# Altium integrated library Utiliti_Library.IntLib: 517 symbols (part 1 of 4) (continued)
## USB_TypeB (continued)
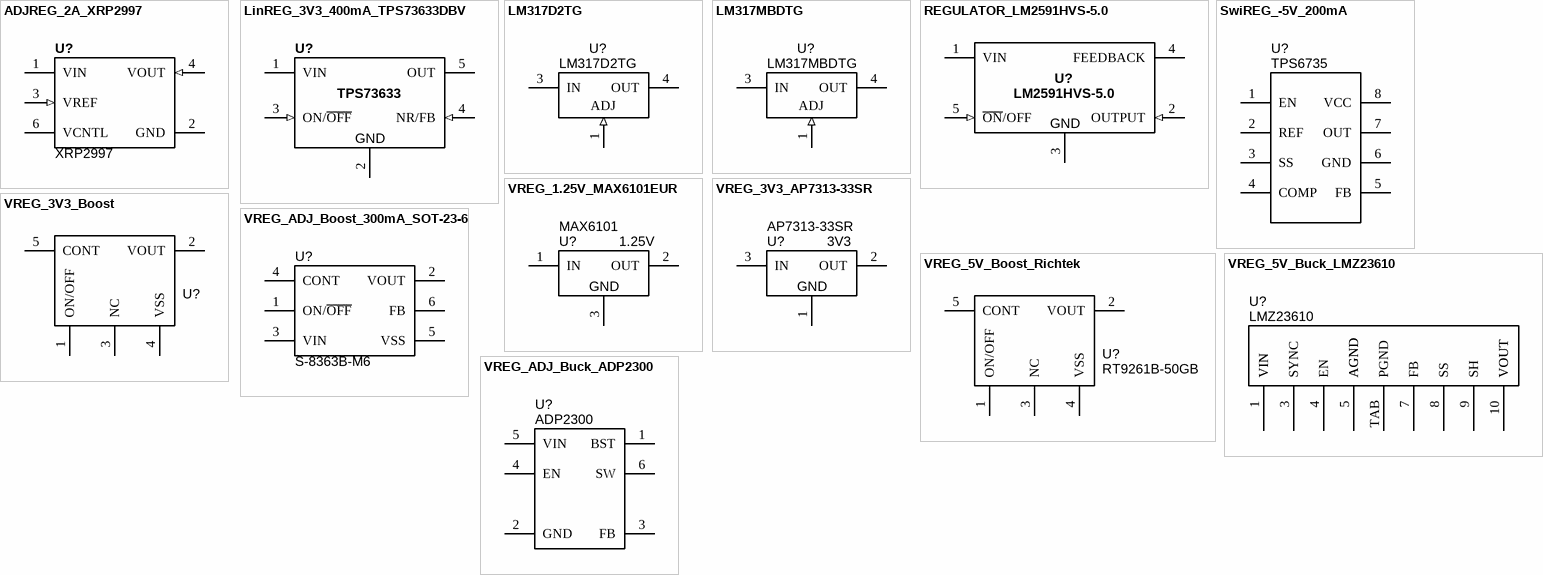
[diagram p2: symbols ADJREG_2A_XRP2997 to VREG_ADJ_Buck_ADP2300]

## ADJREG_2A_XRP2997
designator U?, comment XRP2997
IC Adjustable Regulator 2A 8-SOIC-EP SMD; Manufacturer 1: Exar Corporation; Manufacturer Part Number 1: XRP2997IDBTR-F; Voltage Regulator Type: Switching Buck; Tolerance: ±20mV; Ratings: 5.5Vin Max; Value: 3.3V; 400mA; Voltage - Input: 1.1V to 5.5V; Voltage - Dropout (Typical): 0.075V @ 400mA; Current - Output: 2A (Max); SCDType: spec; Package / Case: 8-SOIC (0.154", 3.90mm Width) Exposed Pad; Voltage - Output: Adjustable; Supplier 1: Digi-Key; Supplier Part Number 1: 1016-1702-1-ND; Operating Temperature: -40°C ~ 85°C
footprint SOIC127P600X175-9N (SOIC, 8-Leads with thermal tab, Body 4.9x3.9mm, Pitch 1.27mm, IPC Medium Density)
pins: 1 VIN (power), 2 GND (power), 3 VREF (in), 4 VOUT (in), 6 VCNTL (power), 9 GND (power) hidden to GND

## LinREG_3V3_400mA_TPS73633DBV
designator U?, comment 3.3V  (value not drawn)
IC LDO Regulator 3.3V 400mA SOT23-5 SMD; Manufacturer 1: Texas Instruments; Manufacturer Part Number 1: TPS73633DBVT; Voltage Regulator Type: Switching Buck; Tolerance: ±0.5%; Ratings: 5.5Vin Max; Value: 3.3V; 400mA; Regulator Topology: Positive Fixed; Voltage - Input: 3.5V to 5.5V; Voltage - Dropout (Typical): 0.075V @ 400mA; Current - Output: 400mA (Max); SCDType: spec; Package / Case: SOT23-5; Supplier 1: Digi-Key; Supplier Part Number 1: 296-15819-1-ND; Voltage - Output: 3.3V; Current - Limit (Min): 400mA; ComponentLink1URL: http://www.ti.com/lit/ds/symlink/tps73601.pdf; ComponentLink1Description: http://www.ti.com/lit/ds/symlink/tps73601.pdf
footprint SOT23-5
pins: 1 VIN (power), 2 GND (power), 3 ON/~{OFF} (in), 4 NR/FB (in), 5 OUT (power)
text: TPS73633

## LM317D2TG
designator U?, comment Manufacturer Part Number 1: LM317D2TG  (hidden comment: Adjustable)
Voltage Regulator IC, D2PAK SMD, LM317D2TG; Manufacturer 1: ON Semiconductor; Voltage Regulator Type: Adjustable Positive Linear; Tolerance: 0.04%; Ratings: 40V; 1.5A; Value: variable; SCDType: spec*; Package / Case: D2PAK; Supplier 1: Digi-Key; Supplier Part Number 1: LM317D2TGOS-ND
footprint D2PAK-3 (D-PAK/TO-263-3; 3 Leads (1 Cropped); Body 14.7 (inc. leads) x 10.2 mm (LxW max))
pins: 1 ADJ (in), 3 IN (power), 4 OUT (power)

## LM317MBDTG
designator U?, comment Manufacturer Part Number 1: LM317MBDTG  (hidden comment: Adjustable)
Voltage Regulator IC, DPAK SMD, LM317MBDTG; Manufacturer 1: ON Semiconductor; Voltage Regulator Type: Adjustable Positive Linear; Tolerance: 0.04%; Ratings: 40V in-out; 500mA; Value: variable; SCDType: spec\; Package / Case: DPAK/TO-252; Supplier 1: Digi-Key; Supplier Part Number 1: LM317MBDTGOS-ND
footprint TO-252 (D-PAK/TO-252-AA; 3 Leads (1 Cropped); Body 10.3 (inc. leads) x 6.7 mm (LxW max))
pins: 1 ADJ (in), 3 IN (power), 4 OUT (power)

## REGULATOR_LM2591HVS-5.0
designator U?, comment Manufacturer Part Number 1: LM2591HVS-5.0  (hidden comment: Adjustable)
Switching Voltage Regulator IC, TO-263-5 SMD, LM2591HVS-5.0; Manufacturer 1: National Semiconductor; Voltage Regulator Type: Switching Buck; Tolerance: ±4%; Ratings: 60Vin Max; 150kHz; Value: 5V; 1A; SCDType: source; Package / Case: TO-263-5; Supplier 1: Digi-Key; Supplier Part Number 1: LM2591HVS-5.0-ND
footprint TO-263-5 (D-PAK/TO-263-5; 5 Leads; Body 14.4 (inc. leads) x 10.4 mm (LxW max))
pins: 1 VIN (power), 2 OUTPUT (in), 3 GND (power), 4 FEEDBACK (power), 5 ~{ON}/OFF (in)

## SwiREG_-5V_200mA
designator U?, comment TPS6735
IC REG 200mA -5V SOIC-8 SMD; Manufacturer 1: Texas Instruments; Manufacturer Part Number 1: TPS6735ID; Ratings: -5V @ 200mA; Output Type: Fixed; Voltage - Input: 4 V ~ 6.2 V; PWM Type: Current Mode; Frequency - Switching: 160kHz; Synchronous Rectifier: No; SCDType: spec; Supplier 1: Digi-Key; Supplier Part Number 1: 296-10982-5-ND; Type: Inverting; Voltage - Output: -5V; Operating Temperature: -40°C ~ 85°C; Supplier Device Package: 8-SOIC; ComponentLink1URL: http://www.ti.com/lit/ds/slvs141a/slvs141a.pdf; ComponentLink1Description: http://www.ti.com/lit/ds/slvs141a/slvs141a.pdf; Package / Case: 8-SOIC (0.154", 3.90mm Width)
footprint SOIC127P600X175-8AN (SOIC, 8-Leads, Body 4.9x3.9mm, Pitch 1.27mm, IPC Medium Density)
pins: 1 EN, 2 REF, 3 SS, 4 COMP, 5 FB, 6 GND, 7 OUT, 8 VCC

## VREG_1.25V_MAX6101EUR
designator U?, comment MAX6101  value 1.25V
Voltage Regulator 1.25V SOT23-3 SMD; Manufacturer 1: Maxim Integrated Products; Manufacturer Part Number 1: MAX6101EUR+T; Voltage Regulator Type: Adjustable Positive Linear; Tolerance: ±0.04%; Ratings: 40V in-out; 500mA; SCDType: spec; Package / Case: SOT23-3; Supplier 1: Digi-Key; Supplier Part Number 1: MAX6101EUR+TCT-ND
footprint SOT23-3 (SOT23, 3 pin)
pins: 1 IN (power), 2 OUT (power), 3 GND (power)

## VREG_3V3_AP7313-33SR
designator U?, comment AP7313-33SR  value 3V3
Voltage Regulator 3.3V LDO SOT23R-3 SMD; Manufacturer 1: Diodes Inc; Manufacturer Part Number 1: AP7313-33SRG-7; Voltage Regulator Type: Low Drop-Out (LDO); Tolerance: ±2%; Ratings: 6Vin; 150mA; SCDType: source; Package / Case: SOT23R-3; Supplier 1: Digi-Key; Supplier Part Number 1: AP7313-33SRG-7DICT-ND; ComponentLink1URL: http://www.diodes.com/datasheets/AP7313.pdf; ComponentLink1Description: AP7313 datasheet
footprint SOT23-3 (SOT23, 3 pin)
pins: 1 GND (power), 2 OUT (power), 3 IN (power)

## VREG_3V3_Boost
designator U?  (value not drawn)
Regulator 3.3V Step-Up Converter; Manufacturer 1: Richtek USA Inc; Manufacturer Part Number 1: RT9261B-33GB; Ratings: 3.3V; 50mA; Output Type: Fixed; Voltage - Input: Up to 7V; PWM Type: VFM; Frequency - Switching: 190kHz; Current - Output: 50mA; Synchronous Rectifier: No; SCDType: undef; Package / Case: SOT-23-5; Type: Step-Up (Boost); Voltage - Output: 3.3V; Operating Temperature: -20°C ~ 85°C; ComponentLink1URL: http://www.richtek.com/download_ds.jsp?s=267; ComponentLink1Description: RT9261B-33GB Datasheet; Supplier Part Number 1: RT9261B-33GB-ND; Supplier 1: Digi-Key
footprint SOT23-5
pins: 1 ON/OFF, 2 VOUT, 3 NC, 4 VSS, 5 CONT

## VREG_5V_Boost_Richtek
designator U?  Manufacturer Part Number 1: RT9261B-50GB  (hidden comment: *)
Regulator VFM 5.0V Step-Up DC-DC Converter; Manufacturer 1: Richtek USA Inc; Ratings: 5V; 160mA; SCDType: source; Package / Case: SOT-23-5; Material: Si; Supplier 1: Digi-Key; Supplier Part Number 1: RT9261B-50GB-ND; ComponentLink1URL: http://www.richtek.com/download_ds.jsp?s=267; ComponentLink1Description: http://www.richtek.com/download_ds.jsp?s=267
footprint SOT23-5
pins: 1 ON/OFF, 2 VOUT, 3 NC, 4 VSS, 5 CONT

## VREG_5V_Buck_LMZ23610
designator U?, comment LMZ23610
Voltage Regulator 10A 5V TO-PMOD-11; Manufacturer 1: National Semiconductor (TI); Manufacturer Part Number 1: LMZ23610TZ/NOPB; Ratings: 6Vin; 50W; Tolerance: ±0.2%; Value: Variable; SCDType: undef; Supplier 1: Digi-Key; Supplier Part Number 1: LMZ23610TZ/NOPB-ND; ComponentLink1URL: http://www.ti.com/lit/ds/symlink/lmz23610.pdf; ComponentLink1Description: http://www.ti.com/lit/ds/symlink/lmz23610.pdf
footprint NATIONALSEMI-TZA11A (National Semi TZA11A package)
pins: 1 VIN, 2 VIN, 3 SYNC, 4 EN, 5 AGND, 6 AGND, 7 FB, 8 SS, 9 SH, 10 VOUT, 11 VOUT, TAB PGND

## VREG_ADJ_Boost_300mA_SOT-23-6
designator U?  Manufacturer Part Number 1: S-8363B-M6  (hidden comment: *)
Regulator adjustable switching step-up DC-DC converter; Manufacturer 1: Seiko Instruments Inc.; Ratings: 5V; 300mA; 1.2MHz; SCDType: source; Package / Case: SOT-23-6; Supplier 1: Mouser; Supplier Part Number 1: 628-S-8363B-M6T1U2; ComponentLink1URL: http://datasheet.sii-ic.com/en/switching_regulator/S8363_E.pdf; ComponentLink1Description: http://datasheet.sii-ic.com/en/switching_regulator/S8363_E.pdf
footprint SOT23-6
pins: 1 ON/~{OFF}, 2 VOUT, 3 VIN (power), 4 CONT, 5 VSS (power), 6 FB (power)

## VREG_ADJ_Buck_ADP2300
designator U?, comment ADP2300
Regulator adjustable switching step-down DC/DC converter; Manufacturer 1: Analog Devices Inc; Manufacturer Part Number 1: ADP2300AUJZ-R7; Ratings: Adj; 1.2A; SCDType: undef; Package / Case: SOT-23-6; Supplier 1: Digi-Key; Supplier Part Number 1: ADP2300AUJZ-R7CT-ND; ComponentLink1URL: http://www.analog.com/static/imported-files/data_sheets/ADP2300_2301.pdf; ComponentLink1Description: http://www.analog.com/static/imported-files/data_sheets/ADP2300_2301.pdf
footprint SOT23-6
pins: 1 BST, 2 GND, 3 FB, 4 EN, 5 VIN, 6 SW


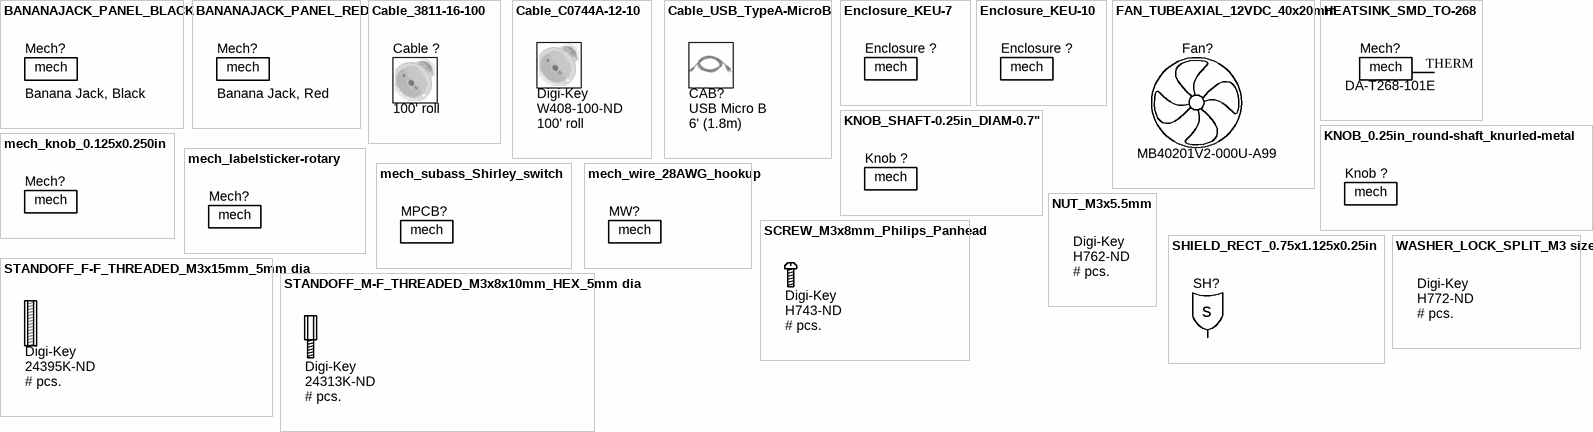
[diagram p3: symbols BANANAJACK_PANEL_BLACK to WASHER_LOCK_SPLIT_M3 size]

## BANANAJACK_PANEL_BLACK
designator Mech?, comment Banana Jack, Black  (mechanical)
Banana jack panel mount black; Manufacturer 1: Emerson Network Power Connectivity Solutions; Manufacturer Part Number 1: 108-0903-001; SCDType: undef; Supplier 1: Digi-Key; Supplier Part Number 1: J152-ND
text: mech

## BANANAJACK_PANEL_RED
designator Mech?, comment Banana Jack, Red  (mechanical)
Banana jack panel mount red; Manufacturer 1: Emerson Network Power Connectivity Solutions; Manufacturer Part Number 1: 108-0902-001; SCDType: undef; Supplier 1: Digi-Key; Supplier Part Number 1: J151-ND
text: mech

## Cable_3811-16-100
designator Cable ?, comment 100' roll  (mechanical)
Ribbon cable 26 AWG 16-conductor 1.27mm pitch; Manufacturer 1: 3M; QtyOverride: .01; Value: 1' section; Number of Conductors: 16; Voltge Rating: 300 V; Stranding: 7 x 34 AWG; SCDType: undef; Supplier 1: Mouser; Supplier Part Number 1: 517-3811/16; Manufacturer Part Number 1: 3811/16-100; Parameter Name: Ribbon Cable; Color: Multicolor

## Cable_C0744A-12-10
designator *, comment 100' roll  Supplier 1: Digi-Key  Supplier Part Number 1: W408-100-ND
Cable, SHIELDED 24AWG UL2464 8 COND; Manufacturer 1: General Cable/Carol Brand; Manufacturer Part Number 1: C0744A-12-10; Cable Type: Multi-Conductor; Conductor Insulation: Poly-Vinyl Chloride (PVC); Conductor Material: Copper, Tinned; Conductor Strand: 7 Strands / 32 AWG; Jacket (Insulation) Diameter: 0.215" (5.46mm); Jacket (Insulation) Thickness: 0.032" (0.81mm); Number of Conductors: 8; Shield Coverage: 100%; Shield Material: Flexfoil®; Shield Type: Foil; Usage: Computer; Voltage: 300V; QtyOverride: .12; Value: 5' section; SCDType: undef; Category: Cables Wires; Color: Gray; Features: Drain Wire; Jacket (Insulation) Material: Poly-Vinyl Chloride (PVC); Length: 100' (30.5m); Operating Temperature: -20°C ~ 80°C; Wire Gauge: 24 AWG; ComponentLink1URL: http://www.generalcable.com/NR/rdonlyres/E79F504B-B22F-45DB-9843-849435C5B1BE/0/Pg39_40MltiCondfoilShield.pdf; ComponentLink1Description: http://www.generalcable.com/NR/rdonlyres/E79F504B-B22F-45DB-9843-849435C5B1BE/0/Pg39_40MltiCondfoilShield.pdf; Package / Case: 100' roll
footprint ClarisonicLogo (Clarisonic Logo 0.360" height)

## Cable_USB_TypeA-MicroB
designator CAB?, comment USB Micro B  Length: 6' (1.8m)  (mechanical)
Cable 6ft USB 2.0 A Male to Micro 5pin Male; Manufacturer 1: Monoprice.com; Manufacturer Part Number 1: 4868; Number of Conductors: 5; Value: 6' section; Cable Type: USB Type A to Micro-B; Wire Gauge: 28/28 AWG; SCDType: undef; Color: Black

## Enclosure_KEU-7
designator Enclosure ?  (value not drawn)  (mechanical)
Enclosure with keyboard panel 5.1x7.1x3.0in; Manufacturer 1: PacTec; Manufacturer Part Number 1: 63100-510-000; SCDType: undef; Supplier 1: Mouser; Supplier Part Number 1: 616-63100-510-000
text: mech

## Enclosure_KEU-10
designator Enclosure ?  (value not drawn)  (mechanical)
Enclosure with keyboard panel 8.1x10.1x4.0in; Manufacturer 1: PacTec; Manufacturer Part Number 1: 62291-510-000 KEU-10 Black Kit; SCDType: undef; Supplier 1: Mouser; Supplier Part Number 1: 616-62291-510-000; ComponentLink1URL: http://www.pactecenclosures.com/Plastic-Enclosures/drw_KEU-10.pdf; ComponentLink1Description: http://www.pactecenclosures.com/Plastic-Enclosures/drw_KEU-10.pdf
text: mech

## FAN_TUBEAXIAL_12VDC_40x20mm
designator Fan?, comment Manufacturer Part Number 1: MB40201V2-000U-A99  (hidden comment: tubeaxial fan)  (mechanical)
Fan tubeaxial 40x20mm 7.7 CFM 21 dBA 12 VDC; Manufacturer 1: Sunon Fans; Noise: 21 dB(A); RPM: 6200 RPM; Power Rating: 0.60W; Voltage - Rated: 12VDC; SCDType: undef; Supplier 1: Digi-Key; Supplier Part Number 1: 259-1554-ND; ComponentLink1URL: http://www.sunon.com.tw/products/pdf/DCFAN/MB4020.pdf; ComponentLink1Description: http://www.sunon.com.tw/products/pdf/DCFAN/MB4020.pdf; Size / Dimension: Square - 40mm L x 40mm H x 20mm W; Weight: 0.068 lb (30.84g)

## HEATSINK_SMD_TO-268
designator Mech?, comment Manufacturer Part Number 1: DA-T268-101E  (hidden comment: SMD heat sink)
Heat sink for TO-268 SMD; Manufacturer 1: Ohmite; For Use With/Related Products: Rotary Switches and Encoders; Power Dissipation @ Temperature Rise: 5W @ 35°C; SCDType: undef; Supplier 1: Digi-Key; Supplier Part Number 1: DA-T268-101E-ND; Height Off Base (Height of Fin): 0.400" (10.16mm); Length: 0.500" (12.70mm); Supplier 2: Digi-Key; Supplier Part Number 2: DV-T268-101E-ND; Manufacturer 2: Ohmite; Manufacturer Part Number 2: DV-T268-101E; ComponentLink2URL: http://media.digikey.com/pdf/Data%20Sheets/Ohmite%20PDFs/D_Series.pdf; ComponentLink2Description: http://media.digikey.com/pdf/Data%20Sheets/Ohmite%20PDFs/D_Series.pdf; ComponentLink1URL: http://media.digikey.com/pdf/Data%20Sheets/Ohmite%20PDFs/D_Series.pdf; ComponentLink1Description: http://media.digikey.com/pdf/Data%20Sheets/Ohmite%20PDFs/D_Series.pdf
footprint HEATSINK_TO-268 (SMD heatsink for use with TO-268 / D3-PAK component)
pins: THERM GND
text: mech

## KNOB_0.25in_round-shaft_knurled-metal
designator Knob ?, comment round knurled knob  (value not drawn)  (mechanical)
Knob metal 0.25in diameter clear matte; Manufacturer 1: Kilo International; Manufacturer Part Number 1: OESA-50-3-5; Accessory Type: Knob - Metal; For Use With/Related Products: 1/4" round shaft potentiometers; Knob / Dial Style: Round 12.7mm with 17.4mm skirt; Shaft Diameter: 6.35mm; SCDType: undef; Shaft Type: Round; Knob Material: metal; Color: Clear matte; Supplier 1: Digi-Key; Supplier Part Number 1: 226-3148-ND; ComponentLink1URL: http://media.digikey.com/pdf/Data%20Sheets/Kilo%20International%20PDFs/OES.pdf; ComponentLink1Description: http://media.digikey.com/pdf/Data%20Sheets/Kilo%20International%20PDFs/OES.pdf
text: mech

## KNOB_SHAFT-0.25in_DIAM-0.7"
designator Knob ?, comment round fluted knob  (value not drawn)  (mechanical)
Knob plastic 0.125in diameter black; Manufacturer 1: GRAYHILL; Manufacturer Part Number 1: 11K5014-KCNB; Accessory Type: Knob - Black; For Use With/Related Products: Rotary Switches and Encoders; Shaft Diameter: 6.35; Knob Material: Nylon; Knob Dia - Imperial: 0.7"; Knob Dia - Metric: 17.78; SCDType: undef; ComponentLink1URL: http://www.grayhill.com/web1/pdf/control%20knob%20accessories%20encoder.pdf; ComponentLink1Description: http://www.grayhill.com/web1/pdf/control%20knob%20accessories%20encoder.pdf; Supplier 1: Newark; Supplier Part Number 1: 05C2120; Knob / Dial Style: Round Fluted; Shaft Type: Round; Color: Black
text: mech

## mech_knob_0.125x0.250in
designator Mech?  (value not drawn)  (mechanical)
Knob plastic 0.125in diameter black; Manufacturer 1: Grayhill Inc; Manufacturer Part Number 1: 11K5017-JCNB; Accessory Type: Knob - Black; For Use With/Related Products: Rotary Switches and Encoders; SCDType: undef; Supplier 1: Digi-Key; Supplier Part Number 1: GH7335-ND; ComponentLink1URL: http://www.grayhill.com/web1/pdf/control%20knob%20accessories%20encoder.pdf; ComponentLink1Description: http://www.grayhill.com/web1/pdf/control%20knob%20accessories%20encoder.pdf
text: mech

## mech_labelsticker-rotary
designator Mech?  (value not drawn)  (mechanical)
Label sticker for rotary switch; Manufacturer 1: Grayhill Inc; Manufacturer Part Number 1: 71SS1073-1; Accessory Type: Stop Pin Sticker; For Use With/Related Products: 71AD Series; SCDType: undef; Supplier 1: Digi-Key; Supplier Part Number 1: 71SS1073-1-ND; ComponentLink1URL: http://lgrws01.grayhill.com/web1/images/ProductImages/Rotary_71.pdf; ComponentLink1Description: http://lgrws01.grayhill.com/web1/images/ProductImages/Rotary_71.pdf
text: mech

## mech_subass_Shirley_switch
designator MPCB?  (value not drawn)  (mechanical)
Assy, PCB switch subassembly; SCDType: undef
text: mech

## mech_wire_28AWG_hookup
designator MW?  (value not drawn)  (mechanical)
Wire, 28AWG, insulated; Manufacturer 1: Any; Value: 45mm piece; SCDType: undef; Package / Case: 28AWG insulated
text: mech

## NUT_M3x5.5mm
designator *, comment # pcs.  Supplier 1: Digi-Key  Supplier Part Number 1: H762-ND  (mechanical)
NUT HEX METRIC M 3 ZINC; Manufacturer 1: B&F Fastener Supply; Manufacturer Part Number 1: MHNZ 003; Thread Size: M3; SCDType: undef; RoHS: RoHS non-compliant; Description 1: NUT HEX METRIC M 3 ZINC; Category: Hardware Fasteners Accessories; Stock 1: 9500; Pricing 1: 100=0.0384, 1000=0.03072 (USD); Type: Hex; Thickness: -; Width: 0.217" (5.5mm); Quantity: -; Material: -; Plating: Zinc

## SCREW_M3x8mm_Philips_Panhead
designator *, comment # pcs.  Supplier 1: Digi-Key  Supplier Part Number 1: H743-ND  (mechanical)
SCREW MACHINE METRIC PH M3X8MM; Manufacturer 1: B&F Fastener Supply; Manufacturer Part Number 1: MPMS 003 0008 PH; Screw Head Type: Phillips Panhead; Thread Size: M3; Head Height: 0.090" (2.29mm); Plating: Zinc; SCDType: undef; RoHS: RoHS non-compliant; Description 1: SCREW MACHINE METRIC PH M3X8MM; Category: Hardware Fasteners Accessories; Stock 1: 8200; Pricing 1: 100=0.066, 1000=0.0528 (USD); Type: Machine Screw; Length - Below Head: 0.315" (8.00mm); Material: -; ComponentLink1URL: http://www.fasnetdirect.com/refguide/Machinepancombo.pdf; ComponentLink1Description: http://www.fasnetdirect.com/refguide/Machinepancombo.pdf

## SHIELD_RECT_0.75x1.125x0.25in
designator SH?  (value not drawn)
Fotofab standard RF shield 0.75x1.125x0.25in; SCDType: undef; Supplier 1: Digi-Key; Supplier Part Number 1: 655-1002-ND; Manufacturer 1: Fotofab; Manufacturer Part Number 1: 0.75 X 1.125 X 0.25
footprint SHIELD_RECT_0.75x1.125x0.25in (Fotofab standard RF shield, 1.125"x0.75", 0.25" tall)
pins: SH
text: s

## STANDOFF_F-F_THREADED_M3x15mm_5mm dia
designator *, comment # pcs.  Supplier 1: Digi-Key  Supplier Part Number 1: 24395K-ND  (mechanical)
STANDOFF METRIC HEX M3 THD 15MM; Manufacturer 1: Keystone Electronics; Manufacturer Part Number 1: 24395; Thread/Screw/Hole Size: M3 Thread; Plating: Nickel; Between Board Height: 0.591" (15.0mm); SCDType: undef; RoHS: RoHS Compliant; Description 1: STANDOFF METRIC HEX M3 THD 15MM; Category: Hardware Fasteners Accessories; Stock 1: 2380; Pricing 1: 10=0.79, 100=0.7595, 500=0.4995, 1000=0.3189, 2500=0.2962 (USD); Type: Hex Threaded, Female/Female; Size: 0.197" (5.0mm) Hex; Length - Overall: 0.590" (15.0mm); Material: Brass; Color: Natural; ComponentLink1URL: http://www.keyelco.com/pdfs/M55-prod30.pdf; ComponentLink1Description: http://www.keyelco.com/pdfs/M55-prod30.pdf

## STANDOFF_M-F_THREADED_M3x8x10mm_HEX_5mm dia
designator *, comment # pcs.  Supplier 1: Digi-Key  Supplier Part Number 1: 24313K-ND  (mechanical)
STANDOFF M/F MET 5MM HEX 10MM L; Manufacturer 1: Keystone Electronics; Manufacturer Part Number 1: 24313; Thread/Screw/Hole Size: M3 Thread; Plating: Nickel; Between Board Height: 0.394" (10.0mm); SCDType: undef; RoHS: RoHS Compliant; Description 1: STANDOFF M/F MET 5MM HEX 10MM L; Category: Hardware Fasteners Accessories; Stock 1: 240; Pricing 1: 10=0.969, 100=0.881, 500=0.58, 1000=0.3685, 2500=0.34215 (USD); Type: Hex Threaded, Male/Female; Size: 0.197" (5.0mm) Hex; Length - Overall: 0.709" (18.0mm); Material: Brass; Color: Natural; ComponentLink1URL: http://www.keyelco.com/pdfs/M55p67.pdf; ComponentLink1Description: http://www.keyelco.com/pdfs/M55p67.pdf

## WASHER_LOCK_SPLIT_M3 size
designator *, comment # pcs.  Supplier 1: Digi-Key  Supplier Part Number 1: H772-ND  (mechanical)
WASHER SPLIT LOCK METRIC M 3 ZINC; Manufacturer 1: B&F Fastener Supply; Manufacturer Part Number 1: MLWZ 003; Description 1: WASHER LOCK METRIC M 3 ZINC; Thread/Screw/Hole Size: Metric 3; SCDType: undef; Category: Hardware Fasteners Accessories; Type: Split Lock; Diameter - Inside: 0.122" (3.1mm); Diameter - Outside: 0.217" (5.5mm); Thickness: 0.039" (1.0mm); Plating: Zinc; Material: Steel


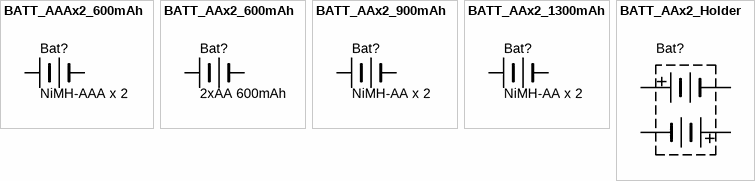
[diagram p4: symbols BATT_AAAx2_600mAh to BATT_AAx2_Holder]

## BATT_AAAx2_600mAh
designator Bat?, comment NiMH-AAA x 2  (no BOM)
Battery pack, 2-cell AAA; Manufacturer 1: JJJ; Manufacturer Part Number 1: NiMH-AAA-2-600-PB7; Ratings: 600 mAh; Package / Case: per dwg
footprint BAT-AAA-2 (AAA battery pack, 2 side by side)
pins: 1, 2

## BATT_AAx2_600mAh
designator Bat?, comment 2xAA 600mAh  (no BOM)
Battery pack NiMH 600mAh 2-cell AA; Manufacturer 1: Gold Peak; Manufacturer Part Number 1: 60AAM2B2H PB3; Package / Case: per dwg; Ratings: 600 mAh
footprint BAT-AA-2 (AA battery, 2 side by side)
pins: 1, 2

## BATT_AAx2_900mAh
designator Bat?, comment NiMH-AA x 2  (no BOM)
Battery pack, 2-cell AA; Manufacturer 1: JJJ; Manufacturer Part Number 1: NiMH-AA-2-900-PB3; Ratings: 900 mAh; Package / Case: per dwg
footprint BAT-AA-2 (AA battery, 2 side by side)
pins: 1, 2

## BATT_AAx2_1300mAh
designator Bat?, comment NiMH-AA x 2  (no BOM)
Battery pack, 2-cell AA; Manufacturer 1: JJJ; Manufacturer Part Number 1: NiMH-AA-2-1300-PB1; Ratings: 1300 mAh; Package / Case: per dwg
footprint BAT-AA-2 (AA battery, 2 side by side)
pins: 1, 2

## BATT_AAx2_Holder
designator Bat?, comment NiMH-AA x 2  (value not drawn)
Battery holder 2xAA PCB mount; Manufacturer 1: MPD (Memory Protection Devices); Manufacturer Part Number 1: BK-6100-PC4; Ratings: 1300 mAh; Battery Type, Function: Cylindrical, Holder; Style: Holder (Open); Battery Cell Size: AA; Number of Cells: 2; Package / Case: per dwg; Supplier 1: Digi-Key; Supplier Part Number 1: BK-6100-PC4-ND; Mounting Type: PCB, Through Hole; Height Above Board: 0.657" (16.69mm); ComponentLink1URL: http://www.memoryprotectiondevices.com/datasheets/BK-6100-PC4-datasheet.pdf; ComponentLink1Description: http://www.memoryprotectiondevices.com/datasheets/BK-6100-PC4-datasheet.pdf
footprint BATT_HOLDER_2XAA (2-cell AA battery holder)
pins: C1+, C1-, C2+, C2-


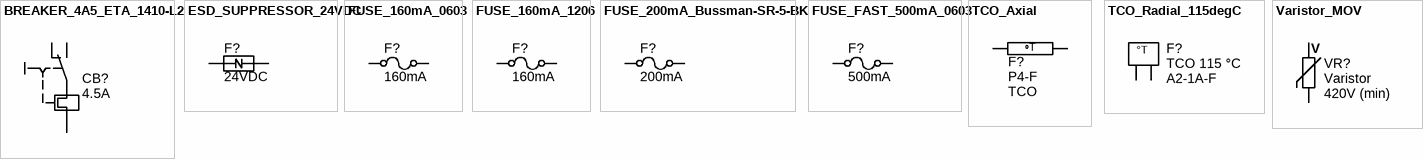
[diagram p5: symbols BREAKER_4A5_ETA_1410-L2 to Varistor_MOV]

## BREAKER_4A5_ETA_1410-L2
designator CB?, comment value 4.5A  (hidden comment: thermal breaker)
Circuit breaker 4.5A PCB mount; Manufacturer 1: E-T-A; Manufacturer Part Number 1: 1410-L210-L2F1-S02-4.5A; Ratings: 4.5A; 28VDC; 240VAC; Voltage: 28VDC, 240VAC; SCDType: spec; Supplier 1: Digi-Key; Supplier Part Number 1: 302-1036-ND; Current - Trip (It): 4.5A
footprint BREAKER_1410-L2 (E-T-A Thermal Overcurrent Circuit Breaker 1410-L2)
pins: 1, 2, 3

## ESD_SUPPRESSOR_24VDC
designator F?, comment value 24VDC  (hidden comment: ESD suppressor)
ESD Suppressor 24VDC 0603 SMD; Manufacturer 1: Cooper Bussmann; Manufacturer Part Number 1: 0603ESDA-TR1; Voltage - Working: 24V; Voltage - Clamping: 35V; SCDType: spec; Package / Case: 0603 (1608 metric); Supplier 1: Digi-Key; Supplier Part Number 1: 283-2535-1-ND; ComponentLink1URL: http://www.cooperindustries.com/content/dam/public/bussmann/Electronics/Resources/Data%20Sheets/Bus_Elx_DS_4082_0603ESDA-TR.pdf; ComponentLink1Description: http://www.cooperindustries.com/content/dam/public/bussmann/Electronics/Resources/Data%20Sheets/Bus_Elx_DS_4082_0603ESDA-TR.pdf
footprint 0603ESDA (Chip ESD suppressor, Body 1.6x0.8mm, 0603, IPC Medium Density)
pins: 1, 2

## FUSE_160mA_0603
designator F?, comment value 160mA  (hidden comment: Slow-blow)
Fuse 160mA 63VDC 0603 SMD; Manufacturer 1: Holly Fuse; Manufacturer Part Number 1: 06T-0160L; Ratings: 160mA; 63VDC; slow-blow; SCDType: spec; Package / Case: 0603 (1608 metric)
footprint RESC1608X55N (Chip Resistor, Body 1.6x0.8mm, EIA 0603, IPC Medium Density)
pins: 1, 2

## FUSE_160mA_1206
designator F?, comment value 160mA  (hidden comment: Slow-blow)
Fuse 160mA 63VDC 1206 SMD; Manufacturer 1: Holly Fuse; Manufacturer Part Number 1: 12T-0160L; Ratings: 160mA; 63VDC; slow-blow; SCDType: spec; Package / Case: 1206 (3216 metric)
footprint RESC3216X70N (Chip Resistor, Body 3.2x1.6mm, EIA 1206, IPC Medium Density)
pins: 1, 2

## FUSE_200mA_Bussman-SR-5-BK
designator F?, comment value 200mA  (hidden comment: Slow-blow)
Fuse 200mA 250VAC Radial 5.08mm pitch; Manufacturer 1: Cooper Bussmann; Manufacturer Part Number 1: SR-5-200MA-BK; Ratings: 200mA; 250VAC; slow-blow; SCDType: source; Package / Case: Radial 5.08mm pitch; Supplier 1: Mouser; Supplier Part Number 1: 504-SR-5-200MA-BK
footprint FUSE_SR-5-BK
pins: 1, 2

## FUSE_FAST_500mA_0603
designator F?, comment value 500mA  (hidden comment: Fast Acting)
Fuse 500mA 32VDC 0603 SMD; Manufacturer 1: AVX Corporation; Manufacturer Part Number 1: F0603E0R50FSTR; Ratings: 500mA; 32VDC; fast acting; DC Cold Resistance: 0.25 Ohm; SCDType: source; Package / Case: 0603 (1608 metric); Fuse Type: Fast Acting; ComponentLink1URL: http://www.avx.com/docs/Catalogs/accug2.pdf; ComponentLink1Description: http://www.avx.com/docs/Catalogs/accug2.pdf; Supplier 1: Digi-Key; Supplier Part Number 1: 478-2860-1-ND; Operating Temperature: -55°C ~ 125°C
footprint RESC1608X55N (Chip Resistor, Body 1.6x0.8mm, EIA 0603, IPC Medium Density)
pins: 1, 2

## TCO_Axial
designator F?, comment TCO  Manufacturer Part Number 1: P4-F
Thermal cutoff axial 2 Amp 130 deg C; Manufacturer 1: Aupo; Ratings: 130°C; 2.0A; 250Vac; SCDType: source; Package / Case: diam. 2.1 x 6.5mm
footprint AUPO_P-4F_BEND1 (Aupo P-4F TCO for positioning on IC legs)
footprint AUPO_P-4F_BEND2 (Aupo P-4F TCO for positioning on IC legs)
footprint AUPO_P-4F_BEND3 (Aupo P-4F TCO for positioning on IC legs)
footprint AUPO_P-4F_BEND4 (Aupo P-4F TCO for positioning on IC legs)
footprint AUPO_P-4F_BEND5 (Aupo P-4F TCO for positioning on IC legs)
footprint AUPO_P-4F_BEND6 (Aupo P-4F TCO for positioning on IC legs)
footprint AUPO_P-4F_BEND6M (Aupo P-4F TCO for positioning on IC legs)
footprint AUPO_P-4F_BEND7 (Aupo P-4F TCO for positioning on IC legs)
footprint AUPO_P-4F_BEND8 (Aupo P-4F TCO for positioning on IC legs)
footprint AUPO_P-4F_BEND8T (Aupo P-4F TCO for positioning on top of FETs)
footprint AUPO_P-4F_BEND8S (Aupo P-4F TCO for positioning beside FETs)
footprint AUPO_P-4F_BEND6SP (Aupo P-4F TCO for positioning on IC legs)
pins: 1, 2
text: T

## TCO_Radial_115degC
designator F?, comment TCO 115 °C  Manufacturer Part Number 1: A2-1A-F
Thermal cutoff radial 1 Amp 115 degrees C; Manufacturer 1: Aupo; Ratings: 115°C; 1.0A; 250Vac; SCDType: spec; Package / Case: 5.2W x 4.0H x 3.5mm Pitch
footprint TCO_Aupo_Ax-1A_Radial_THD (thermal fuse, Ax-1A)
pins: 1, 2
text: °T

## Varistor_MOV
designator VR?, comment Varistor  Ratings: 420V (min)
Varistor 420V min; Manufacturer 1: Bourns Inc.; Manufacturer Part Number 1: MOV-10D621K; Voltage: 620V; SCDType: source; Supplier 1: Digi-Key; Supplier Part Number 1: MOV-10D621K-ND
footprint Varistor_7.62and10mm (Capacitor, Ceramic, Thru-Hole, Dipped Radial; Body 6.8 x 3 mm (WxT) Pin Spacing 7.62 mm (typ))
pins: 1, 2
text: V


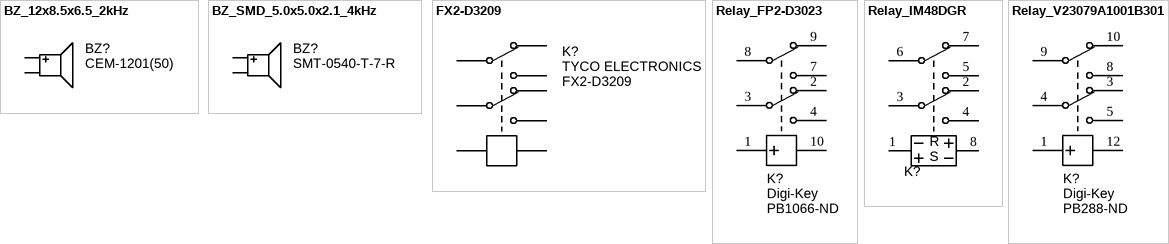
[diagram p6: symbols BZ_12x8.5x6.5_2kHz to Relay_V23079A1001B301]

## BZ_12x8.5x6.5_2kHz
designator BZ?, comment Manufacturer Part Number 1: CEM-1201(50)  (hidden comment: Alternate part: 3100-932)
Speaker, Magnetic Transducer; Manufacturer 1: CUI Inc; Ratings: 2048 ±200 Hz; SCDType: source; Package / Case: 6.5mm pitch; Material: Noryl SE1-J; Supplier 1: Digi-Key; Supplier Part Number 1: 102-1152-ND
footprint BUZZER_12.0X8.5MM
pins: 1 Positive, 2 Negative

## BZ_SMD_5.0x5.0x2.1_4kHz
designator BZ?, comment Manufacturer Part Number 1: SMT-0540-T-7-R  (hidden comment: buzzer SMD)
Buzzer SMD sealed 5.0x5.0x2.1mm LWH 3Vp; Manufacturer 1: PUI Audio, Inc.; Ratings: 4000 ±500 Hz; SCDType: source; Input Type: peak-peak Signal; Frequency: 4kHz; Operating Mode: Continuous; Sound Pressure Level: 78dBA @ 10cm; Package / Case: 5.0x5.0x2.1mm; Technology: Magnetic; Supplier 1: Digi-Key; Supplier Part Number 1: 668-1207-1-ND; RoHS 1: RoHS Compliant; ComponentLink1URL: http://www.puiaudio.com/pdf/SMT-0540-T-7-R.pdf; ComponentLink1Description: http://www.puiaudio.com/pdf/SMT-0540-T-7-R.pdf
footprint BUZZER_SMT28 (Buzzer SMD sealed 5.0 L x 5.0 W x 2.0mm H 5Vp)
pins: 1 Positive, 2 Negative

## FX2-D3209
designator K?  Manufacturer 1: TYCO ELECTRONICS  Manufacturer Part Number 1: FX2-D3209  (hidden comment: *)
TYCO ELECTRONICS - FX2-D3209 - RELAY, PCB, DPCO, 5VDC; Voltage, Coil DC Nom: 5; Coil Resistance: 178; No. of Poles: 2; Contact Configuration: DPDT; Voltage, Contact AC Max: 250; Voltage, Contact DC Max: 220; SCDType: undef; Supplier 1: Newark; Supplier Part Number 1: 97K0381; Category: Switches & Relays; Series: FX2; Max Contact Current AC: 2; ComponentLink1URL: http://www.farnell.com/datasheets/68394.pdf; ComponentLink1Description: http://www.farnell.com/datasheets/68394.pdf
footprint Relay_Tyco_FX2 (Tyco FX2 DPDT 5VDC Relay)
pins: 1, 2, 3, 4, 5, 6, 7, 8

## Relay_FP2-D3023
designator K?, comment Supplier 1: Digi-Key  Supplier Part Number 1: PB1066-ND  (hidden comment: Polarized Monostable DPCO)
Relay, THT, Low-profile, DPDT DPCO Telecom, 5VDC; Manufacturer 1: Tyco Electronics; Manufacturer Part Number 1: D3023; Circuit: DPDT (2 Form C); Control Off Voltage (Min): 0.5 VDC; Control On Voltage (Max): 3.75 VDC; Coil Current: 16mA; Coil Type: Standard; Ratings: 2A @ 30VDC; SCDType: undef; Category: Relays; Termination Style: PC Pin; Coil Voltage: 5VDC; Value: 5VDC; ComponentLink1Description: http://ecommas.tycoelectronics.com/commerce/DocumentDelivery/DDEController?Action=showdoc&DocId=Specification+Or+Standard%7F108-98005%7FE%7Fpdf%7FEnglish%7FENG_SS_108-98005_E.pdf; ComponentLink1URL: http://ecommas.tycoelectronics.com/commerce/DocumentDelivery/DDEController?Action=showdoc&DocId=Specification+Or+Standard%7F108-98005%7FE%7Fpdf%7FEnglish%7FENG_SS_108-98005_E.pdf; Contact Rating @ Voltage: 2A @ 30VDC; Mounting Type: Through Hole; Relay Type: Telecom
footprint Relay_Tyco_FP2 (Tyco FP2 DPDT 5VDC Relay)
pins: 1, 2, 3, 4, 7, 8, 9, 10

## Relay_IM48DGR
designator K?, comment Polarized Monostable DPCO  (value not drawn)
Relay SMD Telecom DPDT latching 2.4VDC; Manufacturer 1: TE Connectivity; Manufacturer Part Number 1: IM48DGR; Circuit: DPDT (2 Form C); Coil Current: 41.7mA; Coil Type: Latching, Single Coil; Ratings: 2A @ 30VDC; Coil Resistance: 58 Ohms; Coil Power: 100 mW; SCDType: undef; Coil Voltage: 2.4VDC; Value: 2.4VDC; Supplier 1: Digi-Key; Supplier Part Number 1: PB1175CT-ND
footprint Relay_TE_IM-Series_Gull (TE Connectivity IM48DGR latching relay, gullwing SMD)
pins: 1, 2, 3, 4, 5, 6, 7, 8
text: R; S

## Relay_V23079A1001B301
designator K?, comment Supplier 1: Digi-Key  Supplier Part Number 1: PB288-ND  (hidden comment: Polarized DPCO)
Relay, PCB Mount, DPDT, Polarized Monostable; Manufacturer 1: Tyco Electronics; Manufacturer Part Number 1: V23079A1001B301; Circuit: DPDT (2 Form C); Coil Voltage: 5VDC; Control Off Voltage (Min): 0.5 VDC; Control On Voltage (Max): 3.75 VDC; Coil Current: 28mA; Coil Type: Standard; Ratings: 2A @ 30VDC; Value: 5VDC; SCDType: undef; Category: Relays; Termination Style: PC Pin
footprint Relay_Tyco_P2 (Tyco P2 DPDT 5VDC V23079 Relay)
pins: 1, 3, 4, 5, 8, 9, 10, 12


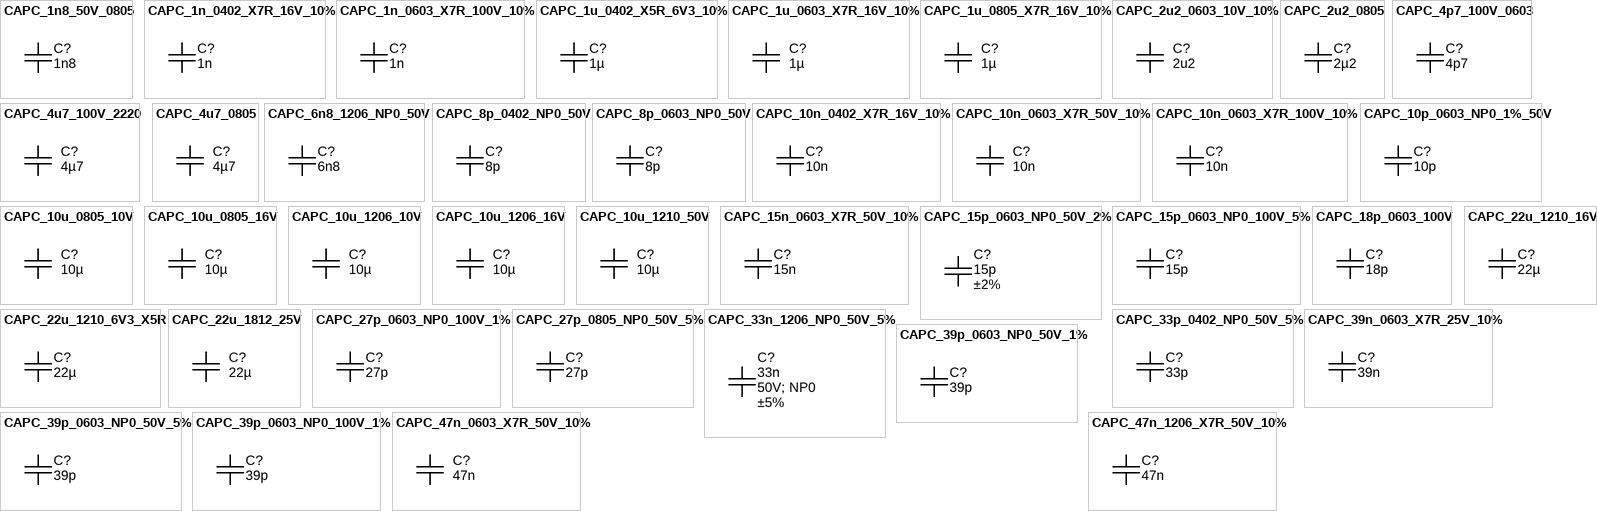
[diagram p7: symbols CAPC_1n8_50V_0805 to CAPC_47n_1206_X7R_50V_10%]

## CAPC_1n8_50V_0805
designator C?, comment value 1n8  (hidden comment: approved sub OK)
Capacitor SMD Cer 1.8nF 10% 50V X7R 0805; Manufacturer 1: AVX Corporation; Manufacturer Part Number 1: 08055C182KAT2A; Ratings: 50V; X7R; SCDType: source*; Tolerance: ±10%; Operating Temperature: -55°C ~ 125°C; Package / Case: 0805 (2012 metric); Supplier 1: Digi-Key; Supplier Part Number 1: 478-1374-1-ND
footprint CAPC2012X135N (Chip Capacitor, Body 2.0x1.2mm, 0805, IPC Medium Density)
pins: 1, 2

## CAPC_1n_0402_X7R_16V_10%
designator C?, comment 1n
Capacitor SMD Cer 1nF 10% 16V X7R 0402; Manufacturer 1: AVX Corporation; Manufacturer Part Number 1: 0402YC102KAT2A; Ratings: 16V; X7R; SCDType: spec; Tolerance: ±10%; Operating Temperature: -55°C ~ 125°C; Package / Case: 0402 (1005 Metric); Size / Dimension: 0.039" L x 0.020" W (1.00mm x 0.50mm); Manufacturer 2: Yageo; Manufacturer Part Number 2: CC0402KRX7R7BB102; Supplier 1: Digi-Key; Supplier Part Number 1: 478-6197-1-ND; ComponentLink1URL: http://www.avx.com/docs/Catalogs/cx7r.pdf; ComponentLink1Description: http://www.avx.com/docs/Catalogs/cx7r.pdf; Supplier 2: Digi-Key; Supplier Part Number 2: 311-1352-1-ND; ComponentLink2URL: http://www.yageo.com/documents/recent/UPY-GPHC_X7R_6.3V-to-50V_8.pdf; ComponentLink2Description: http://www.yageo.com/documents/recent/UPY-GPHC_X7R_6.3V-to-50V_8.pdf; Value: 1n
footprint CAPC1005X55N (Chip Capacitor, Body 1.0x0.5mm, 0402, IPC Medium Density)
pins: 1, 2

## CAPC_1n_0603_X7R_100V_10%
designator C?, comment value 1n  (hidden comment: approved sub OK)
Capacitor SMD Cer 1nF 10% 100V X7R 0603; Manufacturer 1: Murata Electronics North America; Manufacturer Part Number 1: GCM188R72A102KA37D; Ratings: 100V; X7R; Material: ceramic; SCDType: spec; Package / Case: 0603 (1608 metric); Tolerance: ±10%; Supplier 1: Digi-Key; Supplier Part Number 1: 490-4780-1-ND; Operating Temperature: -55°C ~ 125°C; Size / Dimension: 0.063" L x 0.031" W (1.60mm x 0.80mm); Thickness (Max): 0.035" (0.90mm); ComponentLink1URL: http://search.murata.co.jp/Ceramy/image/img/PDF/ENG/GCM188R72A102KA37.pdf; ComponentLink1Description: http://search.murata.co.jp/Ceramy/image/img/PDF/ENG/GCM188R72A102KA37.pdf
footprint CAPC1608X90N (Chip Capacitor, Body 1.6x0.8mm, 0603, IPC Medium Density)
pins: 1, 2

## CAPC_1u_0402_X5R_6V3_10%
designator C?, comment 1µ
Capacitor SMD Cer 1uF 10% 16V X5R 0402; Manufacturer 1: AVX Corporation; Manufacturer Part Number 1: 04026D105KAT2A; Ratings: 6.3V; X5R; SCDType: spec; Tolerance: ±10%; Operating Temperature: -55°C ~ 125°C; Package / Case: 0402 (1005 Metric); Size / Dimension: 0.039" L x 0.020" W (1.00mm x 0.50mm); Supplier 1: Digi-Key; Supplier Part Number 1: 478-2583-1-ND; RoHS 1: RoHS Compliant; ComponentLink1URL: http://www.avx.com/docs/Catalogs/cx5r.pdf; ComponentLink1Description: http://www.avx.com/docs/Catalogs/cx5r.pdf; Supplier 2: Digi-Key; Supplier Part Number 2: 311-1438-1-ND; Manufacturer 2: Yageo; Manufacturer Part Number 2: CC0402KRX5R5BB105; RoHS 2: RoHS Compliant; ComponentLink2URL: http://www.yageo.com/documents/recent/UPY-GPHC_X5R_4V-to-50V_12.pdf; ComponentLink2Description: http://www.yageo.com/documents/recent/UPY-GPHC_X5R_4V-to-50V_12.pdf; Supplier 3: Digi-Key; Supplier Part Number 3: 1276-1010-1-ND; Manufacturer 3: Samsung Electro-Mechanics America, Inc; Manufacturer Part Number 3: CL05A105KQ5NNNC; RoHS 3: RoHS Compliant; ComponentLink3URL: http://www.samsungsem.com/servlet/FileDownload?path=productsearch&sname=CL05A105KQ5NNNC.pdf&oname=CL05A105KQ5NNNC.pdf; ComponentLink3Description: http://www.samsungsem.com/servlet/FileDownload?path=productsearch&sname=CL05A105KQ5NNNC.pdf&oname=CL05A105KQ5NNNC.pdf; Supplier 4: Digi-Key; Supplier Part Number 4: 445-4998-1-ND; Manufacturer 4: TDK Corporation; Manufacturer Part Number 4: C1005X5R0J105K050BB; RoHS 4: RoHS Compliant; ComponentLink4URL: http://product.tdk.com/capacitor/mlcc/en/documents/mlcc_commercial_general_en.pdf; ComponentLink4Description: http://product.tdk.com/capacitor/mlcc/en/documents/mlcc_commercial_general_en.pdf; Supplier 5: Digi-Key; Supplier Part Number 5: 490-1320-1-ND; Manufacturer 5: Murata Electronics North America; Manufacturer Part Number 5: GRM155R60J105KE19D; RoHS 5: RoHS Compliant; ComponentLink5URL: http://www.murata.com/products/catalog/pdf/c02e.pdf; ComponentLink5Description: http://www.murata.com/products/catalog/pdf/c02e.pdf; Value: 1µ
footprint CAPC1005X55N (Chip Capacitor, Body 1.0x0.5mm, 0402, IPC Medium Density)
pins: 1, 2

## CAPC_1u_0603_X7R_16V_10%
designator C?, comment value 1µ  (hidden comment: approved sub OK)
Capacitor SMD Cer 1uF 10% 16V X7R 0603; Manufacturer 1: TDK Corporation; Manufacturer Part Number 1: C1608X7R1C105K; Ratings: 16V; X7R; Material: ceramic; SCDType: spec; Package / Case: 0603 (1608 metric); Tolerance: ±10%; Supplier 1: Digi-Key; Supplier Part Number 1: 445-1604-1-ND; ComponentLink1URL: http://product.tdk.com/capacitor/mlcc/en/documents/mlcc_commercial_general_en.pdf; ComponentLink1Description: http://product.tdk.com/capacitor/mlcc/en/documents/mlcc_commercial_general_en.pdf
footprint CAPC1608X90N (Chip Capacitor, Body 1.6x0.8mm, 0603, IPC Medium Density)
pins: 1, 2

## CAPC_1u_0805_X7R_16V_10%
designator C?, comment value 1µ  (hidden comment: approved sub OK)
Capacitor SMD Cer 1uF 10% 16V X7R 0805; Manufacturer 1: Yageo; Manufacturer Part Number 1: CC0805KKX7R7BB105; Ratings: 16V; X7R; Material: ceramic; SCDType: spec; Package / Case: 0805 (2012 metric); Tolerance: ±10%; Supplier 1: Digi-Key; Supplier Part Number 1: 311-1365-6-ND; RoHS 1: RoHS Compliant; Temperature Coefficient: X7R; ComponentLink1URL: http://www.yageo.com/documents/recent/UPY-GPHC_X7R_6.3V-to-50V_8.pdf; ComponentLink1Description: http://www.yageo.com/documents/recent/UPY-GPHC_X7R_6.3V-to-50V_8.pdf; Supplier 2: Digi-Key; Supplier Part Number 2: 399-1284-6-ND; Manufacturer 2: Kemet; Manufacturer Part Number 2: C0805C105K4RACTU; RoHS 2: RoHS Compliant; ComponentLink2URL: http://www.kemet.com/datasheets&C0805C105K4RACTU; ComponentLink2Description: http://www.kemet.com/datasheets&C0805C105K4RACTU; Supplier 3: Digi-Key; Supplier Part Number 3: 1276-1026-6-ND; Manufacturer 3: Samsung Electro-Mechanics America, Inc; Manufacturer Part Number 3: CL21B105KOFNNNE; RoHS 3: RoHS Compliant; ComponentLink3URL: http://www.samsungsem.com/servlet/FileDownload?type=spec&file=CL21B105KOFNNNE.pdf; ComponentLink3Description: http://www.samsungsem.com/servlet/FileDownload?type=spec&file=CL21B105KOFNNNE.pdf; Supplier 4: Digi-Key; Supplier Part Number 4: 445-1358-6-ND; Manufacturer 4: TDK Corporation; Manufacturer Part Number 4: C2012X7R1C105K125AA; RoHS 4: RoHS Compliant; ComponentLink4URL: http://product.tdk.com/capacitor/mlcc/en/documents/mlcc_commercial_general_en.pdf; ComponentLink4Description: http://product.tdk.com/capacitor/mlcc/en/documents/mlcc_commercial_general_en.pdf
footprint CAPC2012X135N (Chip Capacitor, Body 2.0x1.2mm, 0805, IPC Medium Density)
pins: 1, 2

## CAPC_2u2_0603_10V_10%
designator C?, comment value 2u2  (hidden comment: approved sub OK)
Capacitor SMD Cer 2.2uF 10% 10V X5R 0603; Manufacturer 1: AVX Corporation; Manufacturer Part Number 1: 0603ZD225KAT2A; Ratings: 10V; X5R; Material: ceramic; SCDType: spec; Package / Case: 0603 (1608 metric); Tolerance: ±10%; Supplier 1: Digi-Key; Supplier Part Number 1: 478-6212-1-ND; ComponentLink1URL: http://www.avx.com/docs/Catalogs/cx5r.pdf; ComponentLink1Description: http://www.avx.com/docs/Catalogs/cx5r.pdf
footprint CAPC1608X90N (Chip Capacitor, Body 1.6x0.8mm, 0603, IPC Medium Density)
pins: 1, 2

## CAPC_2u2_0805
designator C?, comment value 2µ2  (hidden comment: approved sub OK)
Capacitor SMD Cer 2.2uF 10% 16V X7R 0805; Manufacturer 1: Kemet; Manufacturer Part Number 1: C0805C225K4RACTU; Ratings: 16V; X7R; SCDType: undef; Supplier 1: Digi-Key; Supplier Part Number 1: 399-3523-1-ND; Tolerance: ±10%; Package / Case: 0805 (2012 metric)
footprint CAPC2012X135N (Chip Capacitor, Body 2.0x1.2mm, 0805, IPC Medium Density)
pins: 1, 2

## CAPC_4p7_100V_0603
designator C?, comment value 4p7  (hidden comment: approved sub OK)
Capacitor SMD Cer 4.7pF ±0.25pF 100V NP0 0603; Manufacturer 1: AVX Corporation; Manufacturer Part Number 1: 06031A4R7CAT2A; Ratings: 100V; NP0; SCDType: source*; Tolerance: ±0.25pF; Operating Temperature: -55°C ~ 125°C; Package / Case: 0603 (1608 metric); Supplier 1: Digi-Key; Supplier Part Number 1: 478-4992-1-ND
footprint CAPC1608X90N (Chip Capacitor, Body 1.6x0.8mm, 0603, IPC Medium Density)
pins: 1, 2

## CAPC_4u7_100V_2220
designator C?, comment value 4µ7  (hidden comment: approved sub OK)
Capacitor SMD Cer 4.7uF 10% 100V X7R 2220; Manufacturer: TDK Corporation; Manufacturer Part Number: C5750X7R2A475K; Ratings: 100V; X7R; Material: ceramic; SCDType: undef; Package / Case: 2220 (5750 Metric); Tolerance: ±10%; Supplier 1: Digi-Key; Supplier Part Number 1: 445-4526-1-ND
footprint CAPC5750X250N (Chip Capacitor, Body 5.7x5.0mm, 2220, IPC Medium Density)
pins: 1, 2

## CAPC_4u7_0805
designator C?, comment value 4µ7  (hidden comment: approved sub OK)
Capacitor SMD Cer 4.7uF 10% 16V X5R 0805; Manufacturer 1: Taiyo Yuden; Manufacturer Part Number 1: EMK212BJ475KG-T; Ratings: 16V; X5R; Material: ceramic; SCDType: spec; Package / Case: 0805 (2012 Metric); Tolerance: ±10%; Supplier 1: Digi-Key; Supplier Part Number 1: 587-1294-1-ND; Operating Temperature: -55°C ~ 85°C; Size / Dimension: 0.079" L x 0.049" W (2.00mm x 1.25mm); Thickness (Max): 0.053" (1.35mm); ComponentLink1URL: http://www.yuden.co.jp/productdata/catalog/en/mlcc01_e.pdf; ComponentLink1Description: http://www.yuden.co.jp/productdata/catalog/en/mlcc01_e.pdf; Supplier 2: Digi-Key; Supplier Part Number 2: 1276-1065-1-ND; Manufacturer 2: Samsung Electro-Mechanics America, Inc; Manufacturer Part Number 2: CL21A475KOFNNNE; RoHS 2: RoHS Compliant; ComponentLink2URL: http://www.samsungsem.com/servlet/FileDownload?type=spec&file=CL21A475KOFNNNE.pdf; ComponentLink2Description: http://www.samsungsem.com/servlet/FileDownload?type=spec&file=CL21A475KOFNNNE.pdf; Supplier 3: Digi-Key; Supplier Part Number 3: 399-8101-1-ND; Manufacturer 3: Kemet; Manufacturer Part Number 3: C0805C475K4PACTU; RoHS 3: RoHS Compliant; ComponentLink3URL: http://capacitoredge.kemet.com/capedge2/DataSheet?pn=C0805C475K4PACTU; ComponentLink3Description: http://capacitoredge.kemet.com/capedge2/DataSheet?pn=C0805C475K4PACTU; Supplier 4: Digi-Key; Supplier Part Number 4: 490-7215-1-ND; Manufacturer 4: Murata Electronics North America; Manufacturer Part Number 4: GRM21BR61C475MA88L; RoHS 4: RoHS Compliant; ComponentLink4URL: http://psearch.murata.com/capacitor/product/GRM21BR61C475MA88#.pdf; ComponentLink4Description: http://psearch.murata.com/capacitor/product/GRM21BR61C475MA88#.pdf; Supplier 5: Digi-Key; Supplier Part Number 5: 445-7640-1-ND; Manufacturer 5: TDK Corporation; Manufacturer Part Number 5: C2012X5R1C475K125AC; RoHS 5: RoHS Compliant; ComponentLink5URL: http://product.tdk.com/capacitor/mlcc/en/documents/mlcc_commercial_general_en.pdf; ComponentLink5Description: http://product.tdk.com/capacitor/mlcc/en/documents/mlcc_commercial_general_en.pdf; RoHS 1: RoHS Compliant
footprint CAPC2012X135N (Chip Capacitor, Body 2.0x1.2mm, 0805, IPC Medium Density)
pins: 1, 2

## CAPC_6n8_1206_NP0_50V
designator C?, comment 6n8
Capacitor SMD Cer 6.8nF 5% 50V NP0 1206; Manufacturer 1: TDK Corporation; Manufacturer Part Number 1: C3216C0G1H682J/0.60; Ratings: 50V; NP0; Material: Ceramic NP0; SCDType: spec; Tolerance: ±5%; Package / Case: 1206 (3216 metric); Supplier 1: Digi-Key; Supplier Part Number 1: 445-4005-1-ND; Value: 6n8
footprint CAPC3216X180N (Chip Capacitor, Body 3.2x1.6mm, 1.8mm H, 1206, IPC Medium Density)
pins: 1, 2

## CAPC_8p_0402_NP0_50V
designator C?, comment 8p
Capacitor SMD Cer 8pF ±0.5pF 50V NP0 0402; Manufacturer 1: Murata Electronics North America; Manufacturer Part Number 1: GRM1555C1H8R0DA01D; Ratings: 50V; NP0; SCDType: spec; Tolerance: ±0.5pF; Operating Temperature: -55°C ~ 125°C; Package / Case: 0402 (1005 Metric); Size / Dimension: 0.039" L x 0.020" W (1.00mm x 0.50mm); Supplier 1: Digi-Key; Supplier Part Number 1: 490-5867-1-ND; Supplier 2: Digi-Key; Supplier Part Number 2: 04025A8R0JAT2A-ND; Manufacturer 2: AVX Corporation; Manufacturer Part Number 2: 04025A8R0JAT2A; ComponentLink2URL: http://www.avx.com/docs/Catalogs/ccog.pdf; ComponentLink2Description: http://www.avx.com/docs/Catalogs/ccog.pdf; ComponentLink1URL: http://search.murata.co.jp/Ceramy/image/img/w_hinm/L0005E.pdf; ComponentLink1Description: http://search.murata.co.jp/Ceramy/image/img/w_hinm/L0005E.pdf; Value: 8p
footprint CAPC1005X55N (Chip Capacitor, Body 1.0x0.5mm, 0402, IPC Medium Density)
pins: 1, 2

## CAPC_8p_0603_NP0_50V
designator C?, comment 8p
Capacitor SMD Cer 8pF ±0.5pF 50V NP0 0603; Manufacturer 1: Murata Electronics North America; Manufacturer Part Number 1: GRM1885C1H8R0DZ01D; Ratings: 50V; NP0; SCDType: undef; Tolerance: ±0.5pF; Operating Temperature: -55°C ~ 125°C; Package / Case: 0603 (1608 Metric); Size / Dimension: 0.063" L x 0.032" W (1.60mm x 0.81mm); Thickness (Max): 0.035" (0.90mm); Supplier 1: Digi-Key; Supplier Part Number 1: 490-1399-1-ND; ComponentLink1URL: http://search.murata.co.jp/Ceramy/image/img/PDF/ENG/GRM1885C1H8R0DZ01.pdf; ComponentLink1Description: GRM1885C1H8R0DZ01 datasheet.pdf; Value: 8p
footprint CAPC1608X90N (Chip Capacitor, Body 1.6x0.8mm, 0603, IPC Medium Density)
pins: 1, 2

## CAPC_10n_0402_X7R_16V_10%
designator C?, comment 10n
Capacitor SMD Cer 10nF 10% 16V X7R 0402; Manufacturer 1: AVX Corporation; Manufacturer Part Number 1: 0402YC103KAT2A; Ratings: 16V; X7R; SCDType: spec; Tolerance: ±10%; Operating Temperature: -55°C ~ 125°C; Package / Case: 0402 (1005 Metric); Size / Dimension: 0.039" L x 0.020" W (1.00mm x 0.50mm); Manufacturer 2: Yageo; Manufacturer Part Number 2: CC0402KRX7R7BB103; Supplier 1: Digi-Key; Supplier Part Number 1: 478-1114-1-ND; ComponentLink1URL: http://www.avx.com/docs/Catalogs/cx7r.pdf; ComponentLink1Description: http://www.avx.com/docs/Catalogs/cx7r.pdf; Supplier 2: Digi-Key; Supplier Part Number 2: 311-1042-1-ND; ComponentLink2URL: http://www.yageo.com/documents/recent/UPY-GPHC_X7R_6.3V-to-50V_8.pdf; ComponentLink2Description: http://www.yageo.com/documents/recent/UPY-GPHC_X7R_6.3V-to-50V_8.pdf; Value: 10n
footprint CAPC1005X55N (Chip Capacitor, Body 1.0x0.5mm, 0402, IPC Medium Density)
pins: 1, 2

## CAPC_10n_0603_X7R_50V_10%
designator C?, comment value 10n  (hidden comment: approved sub OK)
Capacitor SMD Cer 10nF 10% 50V X7R 0603; Manufacturer 1: TDK Corporation; Manufacturer Part Number 1: C1608X7R1H103K; Ratings: 50V; X7R; Material: ceramic; SCDType: spec; Package / Case: 0603 (1608 metric); Tolerance: ±10%; Supplier 1: Digi-Key; Supplier Part Number 1: 445-1311-1-ND; ComponentLink1URL: http://product.tdk.com/capacitor/mlcc/en/documents/mlcc_commercial_general_en.pdf; ComponentLink1Description: http://product.tdk.com/capacitor/mlcc/en/documents/mlcc_commercial_general_en.pdf; Supplier 2: Digi-Key; Supplier Part Number 2: 478-1227-1-ND; Manufacturer 2: AVX Corporation; Manufacturer Part Number 2: 06035C103KAT2A; ComponentLink2URL: http://www.avx.com/docs/Catalogs/cx7r.pdf; ComponentLink2Description: http://www.avx.com/docs/Catalogs/cx7r.pdf
footprint CAPC1608X90N (Chip Capacitor, Body 1.6x0.8mm, 0603, IPC Medium Density)
pins: 1, 2